# Altium footprint library SwagePCB.PcbLib: 117 footprints (part 1 of 8)
Each footprint in its own frame and in the unit in brackets; x right, y up, seen from the top. Pads: shape width x height; smd on the part's side, far side on the other; paste and mask are expansions set on the pad; w line width, h text height; cw(c..) or ccw(c..) is an arc to the next point about the centre after c.
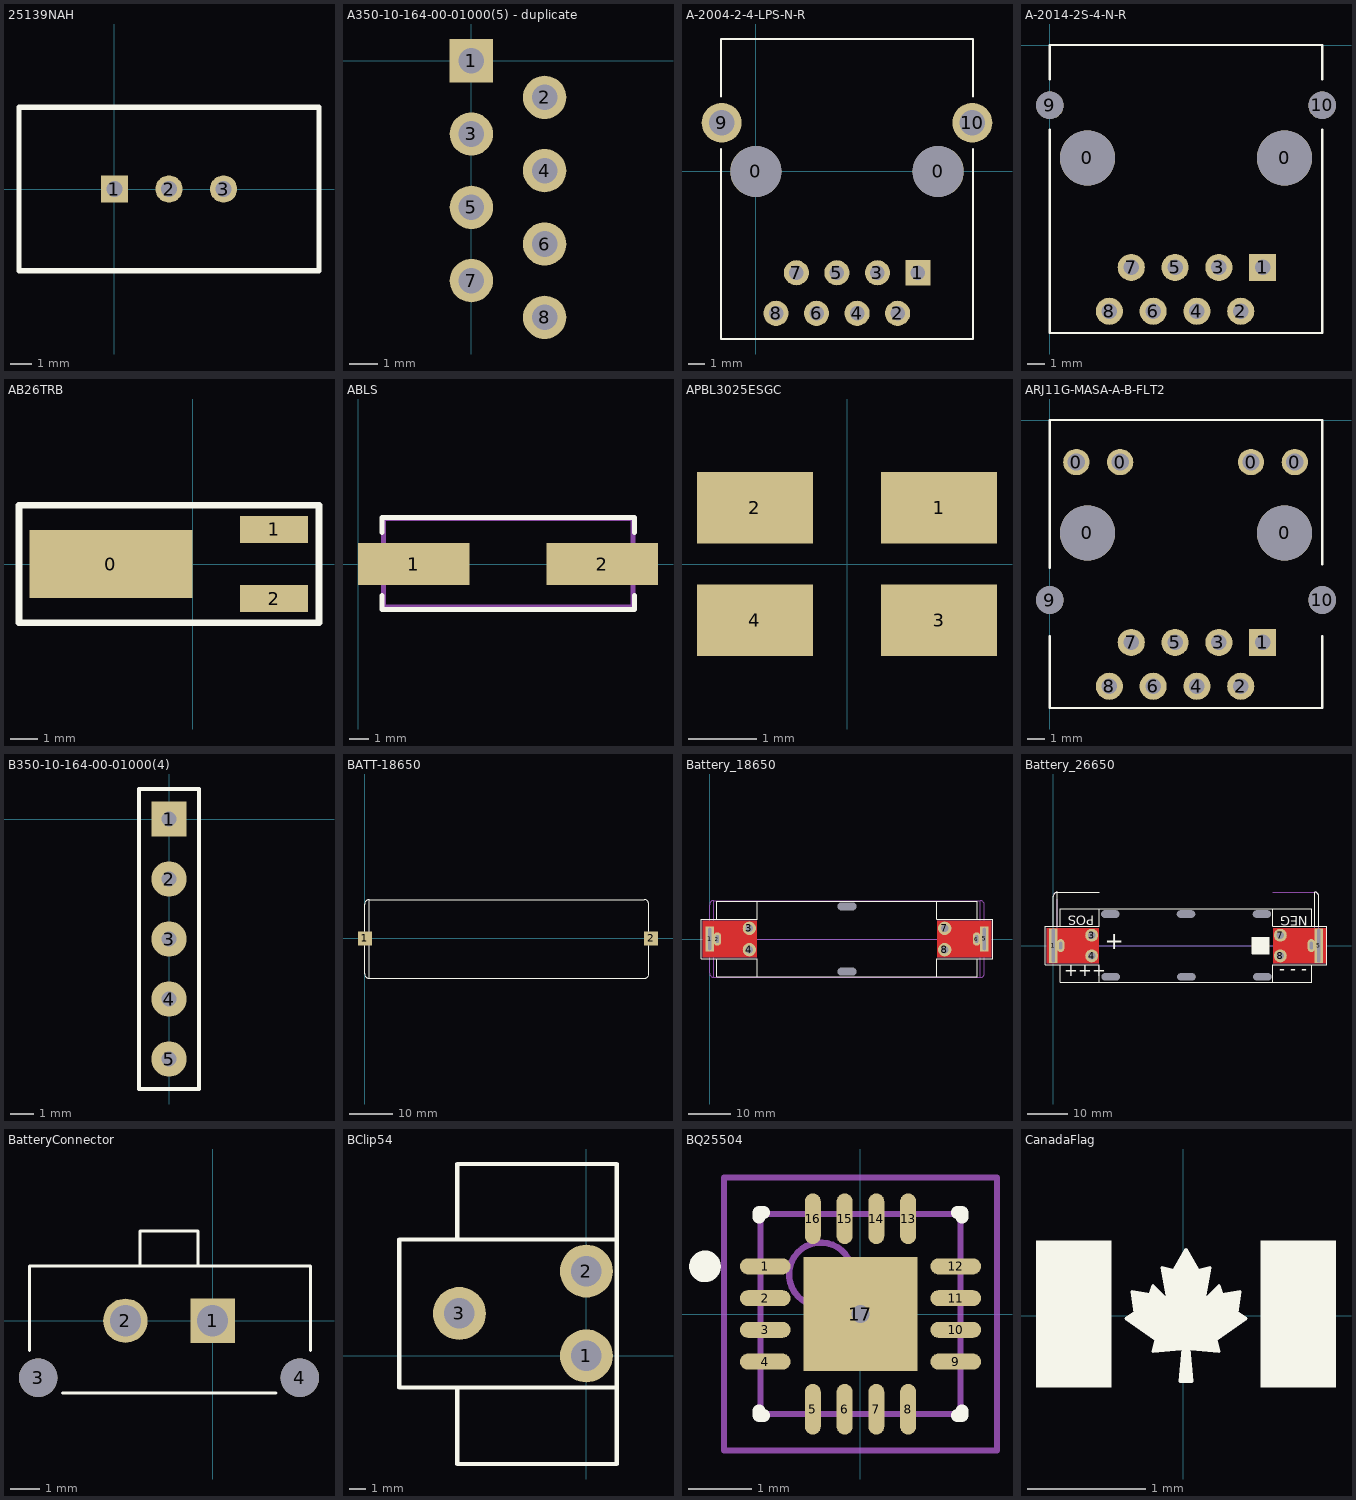
[diagram p0: the footprints below, top view; thin cyan lines are the x and y axes]

## 25139NAH [mil] "Mini Slide Switch 25139NAH - Apem Inc."
height 415
pads (3):
  rect 50x50 hole 30: 1(0,0)
  round 50 hole 30: 2(100,0) 3(200,0)
Top Overlay:
  lines w10: -175,-150 375,-150 375,150 -175,150 -175,-150

## A350-10-164-00-01000(5) - duplicate [mm] "A350-10-164-00-01000(5)"
pads (8):
  rect 1.5x1.5 hole 0.889: 1(0,0)
  round 1.5 hole 0.889: 2(2.54,-1.27) 3(0,-2.54) 4(2.54,-3.81) 5(0,-5.08) 6(2.54,-6.35) 7(0,-7.62) 8(2.54,-8.89)

## A-2004-2-4-LPS-N-R [mm] "RJ45 Connector, Shielded, Right angle"
height 13.3
pads (12):
  round 3.2 hole 3.2 unplated: 0(0,0) 0(11.43,0)
  rect 1.575x1.575 hole 0.9: 1(10.16,-6.35)
  round 1.575 hole 0.9: 2(8.89,-8.89) 3(7.62,-6.35) 4(6.35,-8.89) 5(5.08,-6.35) 6(3.81,-8.89) 7(2.54,-6.35) 8(1.27,-8.89)
  round 2.5 hole 1.6: 9(-2.14,3.05) 10(13.57,3.05)
Top Overlay:
  lines w0.127: -2.185,1.4 -2.185,-5.975 -2.185,-10.5 13.615,-10.5 13.615,-5.975 13.615,1.4 ; -2.185,4.7 -2.185,8.3 13.615,8.3 13.615,4.7
3D body: height 13.3, standoff 0, extent -2.185,-10.5 13.615,8.3

## A-2014-2S-4-N-R [mm] "RJ45 Connector, Vertical"
height 16.5
pads (12):
  round 3.2 hole 3.2: 0(2.185,-6.55) 0(13.615,-6.55)
  rect 1.575x1.575 hole 0.9: 1(12.345,-12.9)
  round 1.575 hole 0.9: 2(11.075,-15.44) 3(9.805,-12.9) 4(8.535,-15.44) 5(7.265,-12.9) 6(5.995,-15.44) 7(4.725,-12.9) 8(3.455,-15.44)
  round 1.6 hole 1.6: 9(0,-3.502) 10(15.8,-3.502)
Top Overlay:
  lines w0.127: 0,-4.9 0,-12.525 0,-16.7 15.8,-16.7 15.8,-12.525 15.8,-4.9 ; 0,-2 0,0 15.8,0 15.8,-2
3D body: height 16.5, standoff 0, extent 0,-16.7 15.8,0

## AB26TRB [mm] "Crystal, SMD, Leaded, Abracon"
height 1.9
pads (3):
  rect 6x2.5 smd: 0(-3,0)
  rect 2.5x1 smd: 1(3,1.27) 2(3,-1.27)
Top Overlay:
  lines w0.254: -6.378,-2.159 -6.378,2.159 4.645,2.159 4.645,-2.159 -6.378,-2.159

## ABLS [mm] "Crystal, SMD, HC/49US, Low Profile"
height 4.2
pads (2):
  rect 5.6x2.1 smd: 1(2.794,0) 2(12.294,0)
Top Overlay:
  lines w0.254: 1.206,-1.587 1.206,-2.286 13.906,-2.286 13.906,-1.587 ; 1.206,1.587 1.206,2.35 13.906,2.35 13.906,1.587
Mechanical 13:
  lines w0.254: 1.27,-2.159 1.27,2.286 13.843,2.286 13.843,-2.159 1.27,-2.159
3D body: height 4.2, standoff 0.1, extent 1.27,-2.159 13.843,2.286

## APBL3025ESGC [mm] "Kingbright BiColor 3mmx2.5mm SMD LED"
height 1.4
pads (4):
  rect 1.7x1.05 smd: 1(1.35,0.825) 2(-1.35,0.825) 3(1.35,-0.825) 4(-1.35,-0.825)

## ARJ11G-MASA-A-B-FLT2 [mm] "RJ45 Connector, Vertical"
height 17
pads (16):
  round 1.524 hole 1: 0(1.54,-2.44) 0(4.08,-2.44) 0(11.67,-2.44) 0(14.21,-2.44)
  round 3.2 hole 3.2: 0(2.185,-6.55) 0(13.615,-6.55)
  rect 1.575x1.575 hole 0.9: 1(12.345,-12.9)
  round 1.575 hole 0.9: 2(11.075,-15.44) 3(9.805,-12.9) 4(8.535,-15.44) 5(7.265,-12.9) 6(5.995,-15.44) 7(4.725,-12.9) 8(3.455,-15.44)
  round 1.6 hole 1.6: 9(0,-10.44) 10(15.8,-10.44)
Top Overlay:
  lines w0.127: 0,-12.525 0,-16.7 15.8,-16.7 15.8,-12.525 ; 0,-8.565 0,-0.94 ; 0,-2 0,0 15.8,0 15.8,-2 ; 15.799,-8.387 15.799,-0.762
3D body: height 16.5, standoff 0, extent 0,-16.7 15.8,0

## B350-10-164-00-01000(4) [mm] "A350-10-164-00-01000(5)"
pads (5):
  rect 1.5x1.5 hole 0.635: 1(0,0)
  round 1.5 hole 0.635: 2(0,-2.54) 3(0,-5.08) 4(0,-7.62) 5(0,-10.16)
Top Overlay:
  lines w0.178: -1.27,-11.43 1.27,-11.43 1.27,1.27 -1.27,1.27 -1.27,-11.43

## BATT-18650 [mil] "Battery, Cylindrical, 18mm x 65mm"
height 708.66
pads (2):
  rect 125x125 smd: 1(3.25,0) 2(2579.5,0)
Top Overlay:
  lines w9.98: 0,-320.83 0,0 ; 2559.06,-319.84 2559.06,0.98
  lines w10: 0,-320.83 ccw(c40.87,-319.37) 42.32,-360.24 ; 0,0 0,309.02 cw(c40.87,307.56) 42.32,348.43 ; 2519.58,348.41 cw(c2518.13,307.54) 2559,308.75 ; 2519.58,348.43 42.32,348.43 ; 2559.06,0.98 2559.06,308.75 ; 2559.32,-320.84 cw(c2518.46,-319.38) 2517,-360.25 42.32,-360.24 ; 42.32,-360.24 42.32,348.43
3D body: height 707.96, standoff 0.7, extent -0.2,-351.41 2558.86,354.45

## Battery_18650 [mil] "Battery, 18mm x 65mm, Keystone Clips + Solder Tabs"
height 708.66
pads (10):
  rect 0x0 hole 70 slot 175 at 0 deg unplated: 0(1285.43,-305)
  round 0 hole 70 slot 175 at 0 deg unplated: 0(1285.43,305)
  rect 78.74x236.22 hole 28 slot 206.69 at 90 deg unplated: 1(0,0) 5(2570.87,0)
  oval 70x125 hole 28 slot 72 at 90 deg: 2(72,0) 6(2499,0)
  round 125 hole 72: 3(372,100) 4(372,-100) 7(2199,100) 8(2199,-100)
Top Layer:
  region: 2637,-170 2637,170 2132,170 2132,-170
  region: -65,170 -65,-170 440,-170 440,170
Bottom Layer:
  region: 2637,-170 2637,170 2132,170 2132,-170
  region: -65,170 -65,-170 440,-170 440,170
Top Overlay:
  lines w10: 67,-354.33 2126.5,-354.33 ; 67,-354 67,-185 ; 67,185 67,354.33 ; 67.33,354.33 444,354.33 ; 444,-354.33 444,-185 -80,-185 -80,185 444,185 444,354.33 ; 2127,-354.33 2127,-185 2651,-185 2651,185 2127,185 2127,354.33 ; 2129,-354.33 2504,-354.33 ; 2504,-353.08 2504,-185 ; 2504,185 2504,354.33 2129,354.33 444,354.33
Mechanical 5:
  lines w9.84: 0,-320.87 ccw(c39.37,-320.87) 39.37,-360.24 ; 0,320.87 cw(c39.37,320.87) 39.37,360.24 ; 39.37,-360.24 39.37,0 39.37,360.24 ; 39.37,-360.24 2531.5,-360.24 ; 39.37,360.24 2531.5,360.24 ; 2531.5,-360.24 ccw(c2531.5,-320.87) 2570.87,-320.87 2570.87,0 2570.87,320.87 ccw(c2531.5,320.87) 2531.5,360.24 ; 2531.5,-360.24 2531.5,0 2531.5,360.24
  lines w10: 0,-320.87 0,320.87 ; 0,0 2570.87,0

## Battery_26650 [mil] "Battery, 26mm x 65mm, Keystone Clips + Solder Tabs"
height 1023.62
pads (14):
  oval 173.23x59.06 hole 70 slot 175 at 0 deg unplated: 0(552.28,304.88) 0(556.22,-303.27) 0(1285.43,305) 0(1289.37,-303.15) 0(2020.87,304.88) 0(2024.8,-303.27)
  rect 78.74x334.65 hole 28 slot 324.8 at 90 deg: 1(0,0) 5(2570.87,0)
  oval 70x125 hole 28 slot 72 at 90 deg: 2(72,0) 6(2499,0)
  round 125 hole 72: 3(372,100) 4(372,-100) 7(2199,100) 8(2199,-100)
Top Layer:
  region: 2637,-170 2637,170 2132,170 2132,-170
  region: -65,170 -65,-170 440,-170 440,170
Bottom Layer:
  region: 2637,-170 2637,170 2132,170 2132,-170
  region: -65,170 -65,-170 440,-170 440,170
Top Overlay:
  region: 2071.85,17.29 2072.17,-14.57 2091.69,-14.57 2091.77,-14.65 2091.97,-14.45 2091.97,17.32
  region: 1948.39,17.17 1928.67,17.17 1928.27,-14.65 1928.39,-14.69 1948.31,-14.65 1948.39,-14.57
  region: 2071.85,17.29 1948.39,17.17 1928.67,17.17 1928.39,82.84 2091.85,82.84 2091.97,17.32
  region: 1948.39,-14.57 2072.17,-14.57 2091.77,-14.65 2091.85,-80.12 1928.39,-80.12 1928.27,-14.65
  pour cut-out: 1948.39,17.17 2072.17,17.17 2072.17,-14.57 1948.39,-14.57
  pour cut-out: 1948.39,17.17 2072.17,17.17 2072.17,-14.57 1948.39,-14.57
  pour cut-out: 1948.39,17.17 2072.17,17.17 2072.17,-14.57 1948.39,-14.57
  lines w2: 1928.39,-80.12 2091.85,-80.12 2091.85,82.84 1928.39,82.84 1928.39,-80.12 ; 1948.39,-14.57 2072.17,-14.57 2072.17,17.17 1948.39,17.17 1948.39,-14.57
  lines w9.84: 0.98,478.35 cw(c40.35,478.35) 40.35,517.72 ; 39.37,185 39.37,517.72 444,517.72 ; 2531.5,185 2531.5,517.72 cw(c2531.5,478.35) 2570.87,478.35 2570.87,185
  lines w10: 0.98,185 0.98,478.35 ; 67,-354.33 2126.5,-354.33 ; 67,-354 67,-185 ; 67,185 67,354.33 ; 67.33,354.33 444,354.33 ; 444,-354.33 444,-185 -80,-185 -80,185 444,185 444,354.33 ; 2127,-354.33 2127,-185 2651,-185 2651,185 2127,185 2127,354.33 ; 2129,-354.33 2504,-354.33 ; 2504,-353.08 2504,-185 ; 2504,185 2504,354.33 2129,354.33 444,354.33
  text "NEG" at 2462.56,317.13 h157.48
  text "POS" at 399.25,323.46 h157.48
  text "+" at 496.3,-87.05 h275.59
  text "+++" at 106.57,-337.36 h196.85
  text "- - -" at 2189.17,-322.72 h196.85
Bottom Overlay:
  pour cut-out: 1948.39,17.2 2072.17,17.2 2072.17,-14.53 1948.39,-14.53
  pour cut-out: 1948.39,17.2 2072.17,17.2 2072.17,-14.53 1948.39,-14.53
  pour cut-out: 1948.39,17.2 2072.17,17.2 2072.17,-14.53 1948.39,-14.53
  region: 1948.39,-14.53 2072.17,-14.53 2091.77,-14.61 2091.85,-80.08 1928.39,-80.08 1928.27,-14.61
  region: 2071.85,17.33 1948.39,17.2 1928.67,17.2 1928.39,82.88 2091.85,82.88 2091.97,17.36
  region: 1948.39,17.2 1928.67,17.2 1928.27,-14.61 1928.39,-14.65 1948.31,-14.61 1948.39,-14.53
  region: 2071.85,17.33 2072.17,-14.53 2091.69,-14.53 2091.77,-14.61 2091.97,-14.41 2091.97,17.36
  lines w2: 1928.39,-80.08 1928.39,82.88 2091.85,82.88 2091.85,-80.08 1928.39,-80.08 ; 1948.39,-14.53 1948.39,17.2 2072.17,17.2 2072.17,-14.53 1948.39,-14.53
  text "+" at 496.3,-85.59 h275.59
  text "POS" at 66.73,323.46 h157.48
  text "NEG" at 2218.54,314.84 h157.48
Mechanical 5:
  lines w9.84: 0.98,478.35 cw(c40.35,478.35) 40.35,517.72 ; 39.37,0 39.37,450 ; 2128,517.72 2531.5,517.72 ; 2531.5,0 2531.5,517.72 ; 2570.87,0 2570.87,478.35 ccw(c2531.5,478.35) 2531.5,517.72
  lines w10: 2.95,0 2573.82,0
3D body: height 1022.61, standoff 1.01, extent -2.21,-507.81 2556.85,511.78

## BatteryConnector [mm] "Molex Header, 0436500215, 2Pin, 3MM"
pads (4):
  rect 1.524x1.524 hole 1.07: 1(0,0)
  round 1.524 hole 1.07: 2(-3.001,0.001)
  round 1.32 hole 1.32 unplated: 3(-6,-1.96) 4(3,-1.96)
Top Overlay:
  lines w0.102: -6.297,-1.027 -6.297,1.884 ; -6.29,1.884 3.36,1.884 3.36,-1.018 ; -5.171,-2.49 2.187,-2.49 ; -2.501,1.883 -2.501,3.084 -0.5,3.084 -0.5,1.883
3D body "436500215.stp": height 9.95, standoff -3.13, extent -6.288,-2.486 3.362,3.084

## BClip54 [mil] "Battery Clip, Keystone, 18650 sized Battery"
height 653
pads (3):
  round 125 hole 72: 1(0,0) 2(0,200) 3(-300,100)
Top Overlay:
  lines w10: -442,-75 70,-75 ; -442,-74.25 -442,275 70,275 ; -305,-75.5 -305,-255.58 70,-255.58 ; -305,275 -305,453.08 70,453.08 ; 72,-255.58 72,453.08

## BQ25504 [mm] "QFN, 16-Leads, Body 3.2x3.2mm (max), Pitch 0.50mm, IPC Medium Density"
height 1
pads (17):
  oval 0.8x0.25 smd: 1(-1.5,0.75) 2(-1.5,0.25) 3(-1.5,-0.25) 4(-1.5,-0.75) 9(1.5,-0.75) 10(1.5,-0.25) 11(1.5,0.25) 12(1.5,0.75)
  oval 0.25x0.8 smd: 5(-0.75,-1.5) 6(-0.25,-1.5) 7(0.25,-1.5) 8(0.75,-1.5) 13(0.75,1.5) 14(0.25,1.5) 15(-0.25,1.5) 16(-0.75,1.5)
  rect 1.8x1.8 smd: 17(0,0)
via 0,0 diameter 0.711 hole 0.279
Top Overlay:
  circle w0.25: c-2.45,0.75 r0.125
  lines w0.2: -1.6,-1.525 -1.6,-1.6 -1.525,-1.6 ; -1.6,1.525 -1.6,1.6 -1.525,1.6 ; 1.525,-1.6 1.6,-1.6 1.6,-1.525 ; 1.525,1.6 1.6,1.6 1.6,1.525
Mechanical 13:
  circle w0.1: c-0.625,0.625 r0.5
  lines w0.1: -1.575,-1.575 1.575,-1.575 1.575,1.575 -1.575,1.575 -1.575,-1.575
Mechanical 15:
  lines w0.1: -0.5,0 0.5,0 ; 0,-0.5 0,0.5 ; -2.15,-2.15 2.15,-2.15 2.15,2.15 -2.15,2.15 -2.15,-2.15
3D body: height 1, standoff 0.08, extent -1.575,-1.575 1.575,1.575

## CanadaFlag [mm] "Canada Flag"
Top Overlay:
  region: 0.025,0.559 0.076,0.457 0.127,0.381 0.229,0.406 0.178,0.127 0.305,0.254 0.33,0.178 0.483,0.203 0.457,0.025 0.533,-0.025 0.279,-0.203 0.305,-0.305 0.076,-0.279 0.051,-0.279 0.076,-0.559 -0.025,-0.559 -0.025,-0.533 0,-0.279 -0.254,-0.305 -0.229,-0.203 -0.483,-0.025 -0.406,0.025 -0.432,0.203 -0.279,0.178 -0.254,0.254 -0.127,0.127 -0.152,0.279 -0.178,0.406 -0.076,0.381 -0.025,0.457
  region: 0.66,0.635 0.66,-0.61 1.295,-0.61 1.295,0.635
  region: -1.245,0.635 -1.245,-0.61 -0.61,-0.61 -0.61,0.635
  lines w0.025: 0,-0.282 -0.025,-0.559 0.076,-0.559 0.051,-0.282 ; -0.483,-0.025 -0.406,0.025 -0.432,0.203 -0.279,0.178 -0.254,0.254 -0.127,0.127 -0.178,0.406 -0.076,0.381 0.025,0.559 0.127,0.381 0.229,0.406 0.178,0.127 0.305,0.254 0.33,0.178 0.483,0.203 0.457,0.025 0.533,-0.025 0.279,-0.203 0.305,-0.305 0.025,-0.279 -0.254,-0.305 -0.229,-0.203 -0.483,-0.025